# Altium footprint library LCD.PcbLib: 21 footprints (part 2 of 2)
Each footprint in its own frame and in the unit in brackets; x right, y up, seen from the top. Pads: shape width x height; smd on the part's side, far side on the other; paste and mask are expansions set on the pad; w line width, h text height; cw(c..) or ccw(c..) is an arc to the next point about the centre after c.
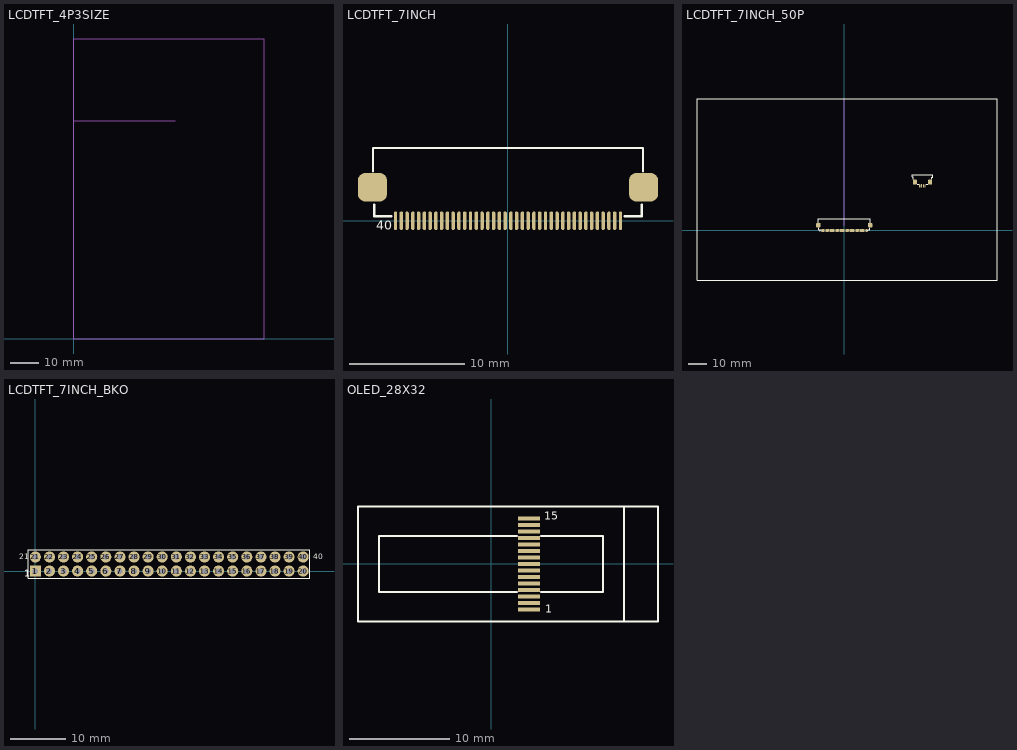
[diagram p1: the footprints below, top view; thin cyan lines are the x and y axes]

## LCDTFT_4P3SIZE [mm] "LCD4.3\" FOR SIZE ONLY"
Mechanical 1:
  lines w0.2: 0,76.7 35.7,76.7 ; 0,0 67.1,0 67.1,105.4 0,105.4 0,0
3D body: height 12.4, standoff 8, extent 0,0 67.1,105.4

## LCDTFT_7INCH [mm] "LCD, TFT, 7\" 800X480"
height 3
pads (42):
  oval 0.3x1.6 smd mask+0.05: 1(9.75,0) 2(9.25,0) 3(8.75,0) 4(8.25,0) 5(7.75,0) 6(7.25,0) 7(6.75,0) 8(6.25,0) 9(5.75,0) 10(5.25,0) 11(4.75,0) 12(4.25,0) 13(3.75,0) 14(3.25,0) 15(2.75,0) 16(2.25,0) 17(1.75,0) 18(1.25,0) 19(0.75,0) 20(0.25,0) 21(-0.25,0) 22(-0.75,0) 23(-1.25,0) 24(-1.75,0) 25(-2.25,0) 26(-2.75,0) 27(-3.25,0) 28(-3.75,0) 29(-4.25,0) 30(-4.75,0) 31(-5.25,0) 32(-5.75,0) 33(-6.25,0) 34(-6.75,0) 35(-7.25,0) 36(-7.75,0) 37(-8.25,0) 38(-8.75,0) 39(-9.25,0) 40(-9.75,0)
  rrect50% 2.5x2.5 smd: ""(-11.75,2.9) ""(11.75,2.9)
Top Overlay:
  lines w0.2: -11.7,4.3 -11.7,6.3 11.7,6.3 11.7,4.3 ; -11.6,1.4 -11.6,0.4 -10.1,0.4 ; 10.1,0.4 11.6,0.4 11.6,1.4
  text "40" at -11.4,-0.8 h0.8
3D body "FH12-40S-0.5SH.stp": height 2.09, standoff -0.01, extent -12.05,-0.3 12.05,6.1

## LCDTFT_7INCH_50P [mm] "LCD, TFT, 7\" 800X480"
height 3
pads (58):
  oval 0.3x1.6 smd mask+0.05: 1(12.25,0) 2(11.75,0) 3(11.25,0) 4(10.75,0) 5(10.25,0) 6(9.75,0) 7(9.25,0) 8(8.75,0) 9(8.25,0) 10(7.75,0) 11(7.25,0) 12(6.75,0) 13(6.25,0) 14(5.75,0) 15(5.25,0) 16(4.75,0) 17(4.25,0) 18(3.75,0) 19(3.25,0) 20(2.75,0) 21(2.25,0) 22(1.75,0) 23(1.25,0) 24(0.75,0) 25(0.25,0) 26(-0.25,0) 27(-0.75,0) 28(-1.25,0) 29(-1.75,0) 30(-2.25,0) 31(-2.75,0) 32(-3.25,0) 33(-3.75,0) 34(-4.25,0) 35(-4.75,0) 36(-5.25,0) 37(-5.75,0) 38(-6.25,0) 39(-6.75,0) 40(-7.25,0) 41(-7.75,0) 42(-8.25,0) 43(-8.75,0) 44(-9.25,0) 45(-9.75,0) 46(-10.25,0) 47(-10.75,0) 48(-11.25,0) 49(-11.75,0) 50(-12.25,0)
  rrect50% 2.5x2.5 smd: ""(-14.25,2.9) ""(14.25,2.9)
  rrect50% 2.3x2.8 smd: ""(38.85,26.56) ""(47.15,26.56)
  oval 0.6x1.8 smd: ""(41.5,24.46) ""(42.5,24.46) ""(43.5,24.46) ""(44.5,24.46)
Top Overlay:
  circle w0.2: c12.8,-0.1 r0.2
  lines w0.2: -14.2,4.3 -14.2,6.3 14.2,6.3 14.2,4.3 ; -14.1,1.4 -14.1,0.4 -12.6,0.4 ; 12.6,0.4 14.1,0.4 14.1,1.4 ; 38,28.11 38,29.41 37.4,29.41 37.4,30.71 48.6,30.71 48.6,29.31 48,29.31 48,28.11 ; 40,25.26 41,25.26 ; 45,25.26 46,25.26 ; -81,-27.51 -81,72.49 84,72.49 84,-27.51 -81,-27.51
  text "50" at -13.9,-0.8 h0.8
Bottom Overlay:
  lines w0.2: -26,70.99 -26,72.99 ; -12.5,2.49 12.5,2.49 ; 0,1.49 0,3.49 ; 42,24.49 44,24.49 ; 43,23.49 43,25.49 ; 54,70.99 54,72.99 ; -81,-27.51 84,-27.51 84,72.49 -81,72.49 -81,-27.51
Mechanical 1:
  lines w0.2: 0,2.49 0,72.49
3D body "FH12-50S-0.5SH.stp": height 2.09, standoff -0.01, extent -14.55,-0.3 14.55,6.1
3D body "2005290040.stp": height 1.93, standoff -0.03, extent 38,24.21 48,29.51

## LCDTFT_7INCH_BKO [mm]
pads (40):
  rect 2x2 hole 1: 1(0,0)
  round 2 hole 1: 2(2.54,0) 3(5.08,0) 4(7.62,0) 5(10.16,0) 6(12.7,0) 7(15.24,0) 8(17.78,0) 9(20.32,0) 10(22.86,0) 11(25.4,0) 12(27.94,0) 13(30.48,0) 14(33.02,0) 15(35.56,0) 16(38.1,0) 17(40.64,0) 18(43.18,0) 19(45.72,0) 20(48.26,0) 21(0,2.54) 22(2.54,2.54) 23(5.08,2.54) 24(7.62,2.54) 25(10.16,2.54) 26(12.7,2.54) 27(15.24,2.54) 28(17.78,2.54) 29(20.32,2.54) 30(22.86,2.54) 31(25.4,2.54) 32(27.94,2.54) 33(30.48,2.54) 34(33.02,2.54) 35(35.56,2.54) 36(38.1,2.54) 37(40.64,2.54) 38(43.18,2.54) 39(45.72,2.54) 40(48.26,2.54)
via -27.07,-0.05 diameter 3 hole 3
via 75.29,-0.04 diameter 3 hole 3
via 75.32,175.01 diameter 3 hole 3
via -27.01,174.99 diameter 3 hole 3
Top Overlay:
  lines w0.2: 24.128,-1.27 49.471,-1.27 49.471,3.81 -1.27,3.81 -1.27,-1.27 24.13,-1.27
  text "1" at -2.032,-1.016 h1.27
  text "21" at -2.941,2.151 h1
  text "40" at 50.108,2.151 h1
3D body: height 11.6, standoff 10, extent -30,-3 78.241,178.053
3D body: height 19.1, standoff 10, extent -25.572,5.023 73.718,170.075

## OLED_28X32 [mm] "OLED Display UG-2832HSWEG04"
height 10
pads (15):
  rect 2.2x0.43 smd: 1(3.802,-4.55) 2(3.802,-3.9) 3(3.802,-3.25) 4(3.802,-2.6) 5(3.802,-1.95) 6(3.802,-1.3) 7(3.802,-0.65) 8(3.802,0) 9(3.802,0.65) 10(3.802,1.3) 11(3.802,1.95) 12(3.802,2.6) 13(3.802,3.25) 14(3.802,3.9) 15(3.802,4.55)
Top Overlay:
  lines w0.2: 2.6,-2.8 -11.2,-2.8 -11.2,2.8 2.6,2.8 ; 5,-2.8 11.2,-2.8 11.2,2.8 5,2.8 ; 13.3,-5.75 13.3,5.75 ; -13.3,-5.75 -13.3,5.75 16.7,5.75 16.7,-5.75 -13.3,-5.75
  text "1" at 5.4,-4.9 h0.8
  text "15" at 5.3,4.4 h0.8
3D body: height 5.9, standoff 5.8, extent 13.5,-3.5 15.5,3.5
3D body: height 5.9, standoff 5.8, extent -13,-2.5 12,4.5
3D body: height 6, standoff 5, extent -13.75,-5.25 16.75,5.25